# Altium schematic symbol library Capacitor - Ceramic - Sumsung.SchLib: 1421 symbols (part 6 of 8) (continued)
## CL31B225KAHNFNE (continued)
CAP CER 2.2UF 25V X7R 1206; Part Number: CL31B225KAHNFNE; Manufacturer: Samsung Electro-Mechanics America, Inc.; TemperatureRange: -55C ~ 125C; Tolerance: 10%; Value: 2.2uF; PartId: 17980; Supplier 1: Digi-Key; Supplier Part Number 1: 1276-3134-2-ND; ComponentLink1Description: Datasheet; ComponentLink1URL: //media.digikey.com/pdf/Data%20Sheets/Samsung%20PDFs/CL31B225KAHNFNE_Spec.pdf; ComponentLink2Description: Digi-Key Listing; ComponentLink2URL: https://www.digikey.com/product-detail/en/samsung-electro-mechanics-america-inc/CL31B225KAHNFNE/1276-3134-2-ND/3888792; TemperatureCoefficient: X7R; Voltage: 25V; Price: 0.0654; Device Package: 1206 (3216 Metric)
footprint CAP 1206/3216 - 1.8MM
pins: 1, 2

## CL31B225KAHNNNE
designator C?, comment 2.2uF
CAP CER 2.2UF 25V X7R 1206; Part Number: CL31B225KAHNNNE; Manufacturer: Samsung Electro-Mechanics America, Inc.; TemperatureRange: -55C ~ 125C; Tolerance: 10%; Value: 2.2uF; PartId: 6168; Supplier 1: Digi-Key; Supplier Part Number 1: 1276-1072-2-ND; ComponentLink1Description: Datasheet; ComponentLink1URL: http://www.samsungsem.com/kr/front/downloadcms.do?path=/kr/support/product-search/mlcc/__icsFiles/afieldfile/2014/11/05&fileName=C_CL31B225KAHNNNE.pdf; ComponentLink2Description: Digi-Key listing; ComponentLink2URL: http://digikey.com/product-detail/en/CL31B225KAHNNNE/1276-1072-2-ND/3886730; TemperatureCoefficient: X7R; Voltage: 25V; Price: 0.0624; Type: -; Device Package: 1206 (3216 Metric)
footprint CAP 1206/3216
pins: 1, 2

## CL31B225KBH4PNE
designator C?, comment 2.2uF
CAP CER 2.2UF 50V X7R 1206; Part Number: CL31B225KBH4PNE; Manufacturer: Samsung Electro-Mechanics America, Inc.; TemperatureRange: -55C ~ 125C; Tolerance: 10%; Type: Open Mode, Soft Termination; Value: 2.2uF; PartId: 6224; Supplier 1: Digi-Key; Supplier Part Number 1: 1276-3136-2-ND; ComponentLink1Description: Datasheet; ComponentLink1URL: http://media.digikey.com/pdf/Data%20Sheets/Samsung%20PDFs/CL31B225KBH4PNE_Spec.pdf; ComponentLink2Description: Digi-Key listing; ComponentLink2URL: http://digikey.com/product-detail/en/CL31B225KBH4PNE/1276-3136-2-ND/3888794; TemperatureCoefficient: X7R; Voltage: 50V; Price: 0.1763; Device Package: 1206 (3216 Metric)
footprint CAP 1206/3216
pins: 1, 2

## CL31B225KBHNFNE
designator C?, comment 2.2uF
CAP CER 2.2UF 50V X7R 1206; Part Number: CL31B225KBHNFNE; Manufacturer: Samsung Electro-Mechanics America, Inc.; TemperatureRange: -55C ~ 125C; Tolerance: 10%; Value: 2.2uF; PartId: 17650; Supplier 1: Digi-Key; Supplier Part Number 1: 1276-3137-2-ND; ComponentLink1Description: Datasheet; ComponentLink1URL: //media.digikey.com/pdf/Data%20Sheets/Samsung%20PDFs/CL31B225KBHNFNE_Spec.pdf; ComponentLink2Description: Digi-Key Listing; ComponentLink2URL: https://www.digikey.com/product-detail/en/samsung-electro-mechanics-america-inc/CL31B225KBHNFNE/1276-3137-2-ND/3888795; TemperatureCoefficient: X7R; Voltage: 50V; Price: 0.0695; Device Package: 1206 (3216 Metric)
footprint CAP 1206/3216 - 1.8MM
pins: 1, 2

## CL31B225KBHNNNE
designator C?, comment 2.2uF
CAP CER 2.2UF 50V X7R 1206; Part Number: CL31B225KBHNNNE; Manufacturer: Samsung Electro-Mechanics America, Inc.; TemperatureRange: -55C ~ 125C; Tolerance: 10%; Value: 2.2uF; PartId: 6173; Supplier 1: Digi-Key; Supplier Part Number 1: 1276-1291-2-ND; ComponentLink1Description: Datasheet; ComponentLink1URL: http://www.samsungsem.com/kr/front/downloadcms.do?path=/kr/support/product-search/mlcc/__icsFiles/afieldfile/2014/11/05&fileName=C_CL31B225KBHNNNE.pdf; ComponentLink2Description: Digi-Key listing; ComponentLink2URL: http://digikey.com/product-detail/en/CL31B225KBHNNNE/1276-1291-2-ND/3886949; TemperatureCoefficient: X7R; Voltage: 50V; Price: 0.0663; Type: -; Device Package: 1206 (3216 Metric)
footprint CAP 1206/3216
pins: 1, 2

## CL31B225KBHVPNE
designator C?, comment 2.2uF
CAP CER 2.2UF 50V X7R 1206; Part Number: CL31B225KBHVPNE; Manufacturer: Samsung Electro-Mechanics America, Inc.; TemperatureRange: -55C ~ 125C; Tolerance: 10%; Value: 2.2uF; PartId: 17750; Supplier 1: Digi-Key; Supplier Part Number 1: 1276-6735-2-ND; ComponentLink1Description: Datasheet; ComponentLink1URL: //media.digikey.com/pdf/Data%20Sheets/Samsung%20PDFs/MLCC_Catalog_2015.pdf; ComponentLink2Description: Digi-Key Listing; ComponentLink2URL: https://www.digikey.com/product-detail/en/samsung-electro-mechanics-america-inc/CL31B225KBHVPNE/1276-6735-2-ND/5961219; TemperatureCoefficient: X7R; Voltage: 50V; Price: 0.1068; Device Package: 1206 (3216 Metric)
footprint CAP 1206/3216 - 1.8MM
pins: 1, 2

## CL31B225KCHSNNE
designator C?, comment 2.2uF
CAP CER 2.2UF 100V X7R 1206; Part Number: CL31B225KCHSNNE; Manufacturer: Samsung Electro-Mechanics America, Inc.; TemperatureRange: -55C ~ 125C; Tolerance: 10%; Value: 2.2uF; PartId: 6260; Supplier 1: Digi-Key; Supplier Part Number 1: 1276-3138-2-ND; ComponentLink1Description: Datasheet; ComponentLink1URL: http://media.digikey.com/pdf/Data%20Sheets/Samsung%20PDFs/CL31B225KCHSNNE_Spec.pdf; ComponentLink2Description: Digi-Key listing; ComponentLink2URL: http://digikey.com/product-detail/en/CL31B225KCHSNNE/1276-3138-2-ND/3888796; TemperatureCoefficient: X7R; Voltage: 100V; Price: 0.3227; Type: -; Device Package: 1206 (3216 Metric)
footprint CAP 1206/3216
pins: 1, 2

## CL31B225KOHNFNE
designator C?, comment 2.2uF
CAP CER 2.2UF 16V X7R 1206; Part Number: CL31B225KOHNFNE; Manufacturer: Samsung Electro-Mechanics America, Inc.; TemperatureRange: -55C ~ 125C; Tolerance: 10%; Value: 2.2uF; PartId: 17623; Supplier 1: Digi-Key; Supplier Part Number 1: 1276-3140-2-ND; ComponentLink1Description: Datasheet; ComponentLink1URL: //media.digikey.com/pdf/Data%20Sheets/Samsung%20PDFs/CL31B225KOHNFNE_Spec.pdf; ComponentLink2Description: Digi-Key Listing; ComponentLink2URL: https://www.digikey.com/product-detail/en/samsung-electro-mechanics-america-inc/CL31B225KOHNFNE/1276-3140-2-ND/3888798; TemperatureCoefficient: X7R; Voltage: 16V; Price: 0.0562; Device Package: 1206 (3216 Metric)
footprint CAP 1206/3216 - 1.8MM
pins: 1, 2

## CL31B225KOHNNNE
designator C?, comment 2.2uF
CAP CER 2.2UF 16V X7R 1206; Part Number: CL31B225KOHNNNE; Manufacturer: Samsung Electro-Mechanics America, Inc.; TemperatureRange: -55C ~ 125C; Tolerance: 10%; Value: 2.2uF; PartId: 17506; Supplier 1: Digi-Key; Supplier Part Number 1: 1276-1264-2-ND; ComponentLink1Description: Datasheet; ComponentLink1URL: http://www.samsungsem.com/kr/front/downloadcms.do?path=/kr/support/product-search/mlcc/__icsFiles/afieldfile/2014/11/05&fileName=C_CL31B225KOHNNNE.pdf; ComponentLink2Description: Digi-Key Listing; ComponentLink2URL: https://www.digikey.com/product-detail/en/samsung-electro-mechanics-america-inc/CL31B225KOHNNNE/1276-1264-2-ND/3886922; TemperatureCoefficient: X7R; Voltage: 16V; Price: 0.0562; Device Package: 1206 (3216 Metric)
footprint CAP 1206/3216 - 1.8MM
pins: 1, 2

## CL31B225KOHNNWE
designator C?, comment 2.2uF
CAP CER 2.2UF 16V X7R 1206; Part Number: CL31B225KOHNNWE; Manufacturer: Samsung Electro-Mechanics America, Inc.; TemperatureRange: -55C ~ 125C; Tolerance: 10%; Value: 2.2uF; PartId: 17899; Supplier 1: Digi-Key; Supplier Part Number 1: 1276-3141-2-ND; ComponentLink1Description: Datasheet; ComponentLink1URL: //media.digikey.com/pdf/Data%20Sheets/Samsung%20PDFs/CL31B225KOHNNWE_Spec.pdf; ComponentLink2Description: Digi-Key Listing; ComponentLink2URL: https://www.digikey.com/product-detail/en/samsung-electro-mechanics-america-inc/CL31B225KOHNNWE/1276-3141-2-ND/3888799; TemperatureCoefficient: X7R; Voltage: 16V; Price: 0.0562; Device Package: 1206 (3216 Metric)
footprint CAP 1206/3216 - 1.8MM
pins: 1, 2

## CL31B225MOHNNNE
designator C?, comment 2.2uF
CAP CER 2.2UF 16V X7R 1206; Part Number: CL31B225MOHNNNE; Manufacturer: Samsung Electro-Mechanics America, Inc.; TemperatureRange: -55C ~ 125C; Tolerance: 20%; Value: 2.2uF; PartId: 6166; Supplier 1: Digi-Key; Supplier Part Number 1: 1276-3143-2-ND; ComponentLink1Description: Datasheet; ComponentLink1URL: http://media.digikey.com/pdf/Data%20Sheets/Samsung%20PDFs/CL31B225MOHNNNE_Spec.pdf; ComponentLink2Description: Digi-Key listing; ComponentLink2URL: http://digikey.com/product-detail/en/CL31B225MOHNNNE/1276-3143-2-ND/3888801; TemperatureCoefficient: X7R; Voltage: 16V; Price: 0.0537; Type: -; Device Package: 1206 (3216 Metric)
footprint CAP 1206/3216
pins: 1, 2

## CL31B226KPHNFNE
designator C?, comment 22uF
CAP CER 22UF 10V X7R 1206; Part Number: CL31B226KPHNFNE; Manufacturer: Samsung Electro-Mechanics America, Inc.; TemperatureRange: -55C ~ 125C; Tolerance: 10%; Value: 22uF; PartId: 15910; Supplier 1: Digi-Key; Supplier Part Number 1: 1276-3145-2-ND; ComponentLink1Description: Datasheet; ComponentLink1URL: //media.digikey.com/pdf/Data%20Sheets/Samsung%20PDFs/CL31B226KPHNFNE_Character.pdf; ComponentLink2Description: Digi-Key Listing; ComponentLink2URL: https://www.digikey.com/product-detail/en/samsung-electro-mechanics-america-inc/CL31B226KPHNFNE/1276-3145-2-ND/3888803; TemperatureCoefficient: X7R; Voltage: 10V; Price: 0.1682; Device Package: 1206 (3216 Metric)
footprint CAP 1206/3216
pins: 1, 2

## CL31B226KPHNNNE
designator C?, comment 22uF
CAP CER 22UF 10V X7R 1206; Part Number: CL31B226KPHNNNE; Manufacturer: Samsung Electro-Mechanics America, Inc.; TemperatureRange: -55C ~ 125C; Tolerance: 10%; Value: 22uF; PartId: 6218; Supplier 1: Digi-Key; Supplier Part Number 1: 1276-2769-2-ND; ComponentLink1Description: Datasheet; ComponentLink1URL: http://www.samsungsem.com/kr/support/product-search/mlcc/CL31B226KPHNNNE.jsp; ComponentLink2Description: Digi-Key listing; ComponentLink2URL: http://digikey.com/product-detail/en/CL31B226KPHNNNE/1276-2769-2-ND/3888427; TemperatureCoefficient: X7R; Voltage: 10V; Price: 0.1652; Type: -; Device Package: 1206 (3216 Metric)
footprint CAP 1206/3216
pins: 1, 2

## CL31B226KQHNNNE
designator C?, comment 22uF
CAP CER 22UF 6.3V X7R 1206; Part Number: CL31B226KQHNNNE; Manufacturer: Samsung Electro-Mechanics America, Inc.; TemperatureRange: -55C ~ 125C; Tolerance: 10%; Value: 22uF; PartId: 15909; Supplier 1: Digi-Key; Supplier Part Number 1: 1276-3146-2-ND; ComponentLink1Description: Datasheet; ComponentLink1URL: //media.digikey.com/pdf/Data%20Sheets/Samsung%20PDFs/CL31B226KQHNNNE_Spec.pdf; ComponentLink2Description: Digi-Key Listing; ComponentLink2URL: https://www.digikey.com/product-detail/en/samsung-electro-mechanics-america-inc/CL31B226KQHNNNE/1276-3146-2-ND/3888804; TemperatureCoefficient: X7R; Voltage: 6.3V; Price: 0.1682; Device Package: 1206 (3216 Metric)
footprint CAP 1206/3216
pins: 1, 2

## CL31B226KQHNNWE
designator C?, comment 22uF
CAP CER 22UF 6.3V X7R 1206; Part Number: CL31B226KQHNNWE; Manufacturer: Samsung Electro-Mechanics America, Inc.; TemperatureRange: -55C ~ 125C; Tolerance: 10%; Value: 22uF; PartId: 15990; Supplier 1: Digi-Key; Supplier Part Number 1: 1276-3147-2-ND; ComponentLink1Description: Datasheet; ComponentLink1URL: //media.digikey.com/pdf/Data%20Sheets/Samsung%20PDFs/CL31B226KQHNNWE_Character.pdf; ComponentLink2Description: Digi-Key Listing; ComponentLink2URL: https://www.digikey.com/product-detail/en/samsung-electro-mechanics-america-inc/CL31B226KQHNNWE/1276-3147-2-ND/3888805; TemperatureCoefficient: X7R; Voltage: 6.3V; Price: 0.1682; Device Package: 1206 (3216 Metric)
footprint CAP 1206/3216
pins: 1, 2

## CL31B226MPHNNNE
designator C?, comment 22uF
CAP CER 22UF 10V X7R 1206; Part Number: CL31B226MPHNNNE; Manufacturer: Samsung Electro-Mechanics America, Inc.; TemperatureRange: -55C ~ 125C; Tolerance: 20%; Value: 22uF; PartId: 15898; Supplier 1: Digi-Key; Supplier Part Number 1: 1276-3148-2-ND; ComponentLink1Description: Datasheet; ComponentLink1URL: //media.digikey.com/pdf/Data%20Sheets/Samsung%20PDFs/CL31B226MPHNNNE_Character.pdf; ComponentLink2Description: Digi-Key Listing; ComponentLink2URL: https://www.digikey.com/product-detail/en/samsung-electro-mechanics-america-inc/CL31B226MPHNNNE/1276-3148-2-ND/3888806; TemperatureCoefficient: X7R; Voltage: 10V; Price: 0.1441; Device Package: 1206 (3216 Metric)
footprint CAP 1206/3216
pins: 1, 2

## CL31B331KBCNNNC
designator C?, comment 330pF
CAP CER 330PF 50V X7R 1206; Part Number: CL31B331KBCNNNC; Manufacturer: Samsung Electro-Mechanics America, Inc.; TemperatureRange: -55C ~ 125C; Tolerance: 10%; Value: 330pF; PartId: 17292; Supplier 1: Digi-Key; Supplier Part Number 1: 1276-2771-2-ND; ComponentLink1Description: Datasheet; ComponentLink1URL: http://www.samsungsem.com/kr/support/product-search/mlcc/__icsFiles/afieldfile/2016/08/18/S_CL31B331KBCNNNC.pdf; ComponentLink2Description: Digi-Key Listing; ComponentLink2URL: https://www.digikey.com/product-detail/en/samsung-electro-mechanics-america-inc/CL31B331KBCNNNC/1276-2771-2-ND/3888429; TemperatureCoefficient: X7R; Voltage: 50V; Price: 0.0325; Device Package: 1206 (3216 Metric)
footprint CAP 1206/3216 - 1.0MM
pins: 1, 2

## CL31B331KHFNNNE
designator C?, comment 330pF
CAP CER 330PF 630V X7R 1206; Part Number: CL31B331KHFNNNE; Manufacturer: Samsung Electro-Mechanics America, Inc.; TemperatureRange: -55C ~ 125C; Tolerance: 10%; Value: 330pF; PartId: 15479; Supplier 1: Digi-Key; Supplier Part Number 1: 1276-3150-2-ND; ComponentLink1Description: Datasheet; ComponentLink1URL: //media.digikey.com/pdf/Data%20Sheets/Samsung%20PDFs/CL31B331KHFNNNE_Spec.pdf; ComponentLink2Description: Digi-Key Listing; ComponentLink2URL: https://www.digikey.com/product-detail/en/samsung-electro-mechanics-america-inc/CL31B331KHFNNNE/1276-3150-2-ND/3888808; TemperatureCoefficient: X7R; Voltage: 630V; Price: 0.0495; Device Package: 1206 (3216 Metric)
footprint CAP 1206/3216
pins: 1, 2

## CL31B332KBCNNNC
designator C?, comment 3300pF
CAP CER 3300PF 50V X7R 1206; Part Number: CL31B332KBCNNNC; Manufacturer: Samsung Electro-Mechanics America, Inc.; TemperatureRange: -55C ~ 125C; Tolerance: 10%; Value: 3300pF; PartId: 17170; Supplier 1: Digi-Key; Supplier Part Number 1: 1276-2772-2-ND; ComponentLink1Description: Datasheet; ComponentLink1URL: http://www.samsungsem.com/kr/support/product-search/mlcc/__icsFiles/afieldfile/2016/08/18/S_CL31B332KBCNNNC.pdf; ComponentLink2Description: Digi-Key Listing; ComponentLink2URL: https://www.digikey.com/product-detail/en/samsung-electro-mechanics-america-inc/CL31B332KBCNNNC/1276-2772-2-ND/3888430; TemperatureCoefficient: X7R; Voltage: 50V; Price: 0.0325; Device Package: 1206 (3216 Metric)
footprint CAP 1206/3216 - 1.0MM
pins: 1, 2

## CL31B332KHFNFNE
designator C?, comment 3300pF
CAP CER 3300PF 630V X7R 1206; Part Number: CL31B332KHFNFNE; Manufacturer: Samsung Electro-Mechanics America, Inc.; TemperatureRange: -55C ~ 125C; Tolerance: 10%; Value: 3300pF; PartId: 15509; Supplier 1: Digi-Key; Supplier Part Number 1: 1276-3153-2-ND; ComponentLink1Description: Datasheet; ComponentLink1URL: //media.digikey.com/pdf/Data%20Sheets/Samsung%20PDFs/CL31B332KHFNFNE_Character.pdf; ComponentLink2Description: Digi-Key Listing; ComponentLink2URL: https://www.digikey.com/product-detail/en/samsung-electro-mechanics-america-inc/CL31B332KHFNFNE/1276-3153-2-ND/3888811; TemperatureCoefficient: X7R; Voltage: 630V; Price: 0.0343; Device Package: 1206 (3216 Metric)
footprint CAP 1206/3216
pins: 1, 2

## CL31B332KHFSFNE
designator C?, comment 3300pF
CAP CER 3300PF 630V X7R 1206; Part Number: CL31B332KHFSFNE; Manufacturer: Samsung Electro-Mechanics America, Inc.; TemperatureRange: -55C ~ 125C; Tolerance: 10%; Value: 3300pF; PartId: 15510; Supplier 1: Digi-Key; Supplier Part Number 1: 1276-3154-2-ND; ComponentLink1Description: Datasheet; ComponentLink1URL: //media.digikey.com/pdf/Data%20Sheets/Samsung%20PDFs/CL31B332KHFSFNE_Character.pdf; ComponentLink2Description: Digi-Key Listing; ComponentLink2URL: https://www.digikey.com/product-detail/en/samsung-electro-mechanics-america-inc/CL31B332KHFSFNE/1276-3154-2-ND/3888812; TemperatureCoefficient: X7R; Voltage: 630V; Price: 0.0343; Device Package: 1206 (3216 Metric)
footprint CAP 1206/3216
pins: 1, 2

## CL31B333JBCNNNC
designator C?, comment 0.033uF
CAP CER 0.033UF 50V X7R 1206; Part Number: CL31B333JBCNNNC; Manufacturer: Samsung Electro-Mechanics America, Inc.; TemperatureRange: -55C ~ 125C; Tolerance: 5%; Value: 0.033uF; PartId: 17165; Supplier 1: Digi-Key; Supplier Part Number 1: 1276-1774-2-ND; ComponentLink1Description: Datasheet; ComponentLink1URL: http://www.samsungsem.com/kr/support/product-search/mlcc/__icsFiles/afieldfile/2016/08/18/S_CL31B333JBCNNNC.pdf; ComponentLink2Description: Digi-Key Listing; ComponentLink2URL: https://www.digikey.com/product-detail/en/samsung-electro-mechanics-america-inc/CL31B333JBCNNNC/1276-1774-2-ND/3887432; TemperatureCoefficient: X7R; Voltage: 50V; Price: 0.0365; Device Package: 1206 (3216 Metric)
footprint CAP 1206/3216 - 1.0MM
pins: 1, 2

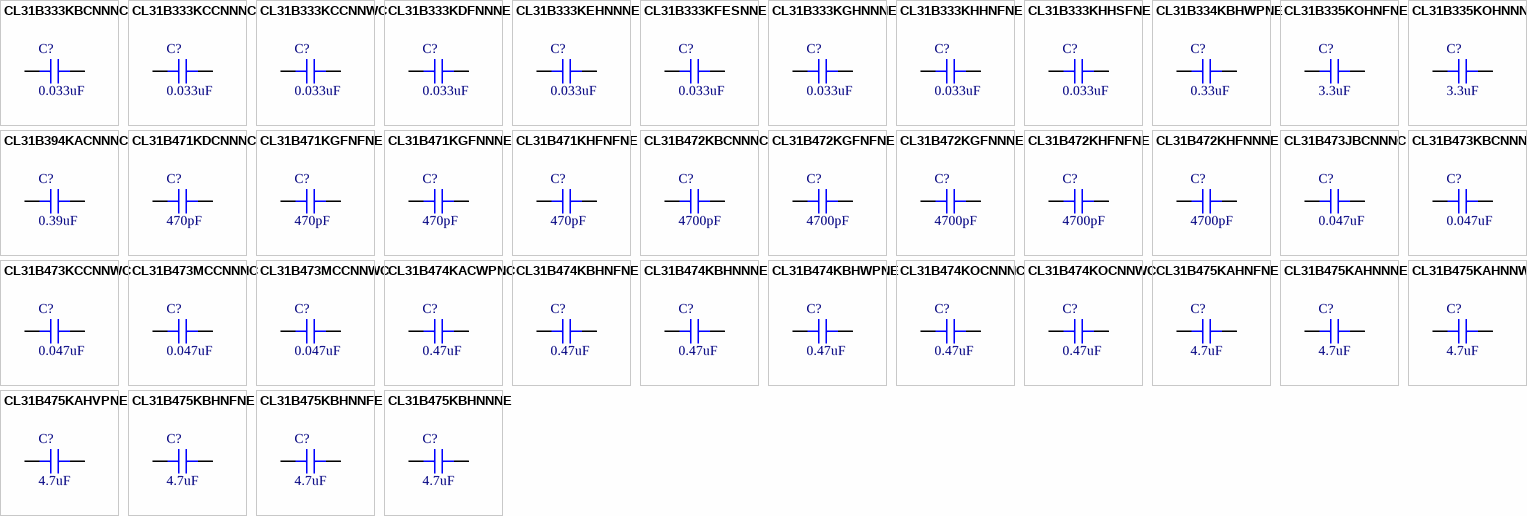
[diagram p28: symbols CL31B333KBCNNNC to CL31B475KBHNNNE]

## CL31B333KBCNNNC
designator C?, comment 0.033uF
CAP CER 0.033UF 50V X7R 1206; Part Number: CL31B333KBCNNNC; Manufacturer: Samsung Electro-Mechanics America, Inc.; TemperatureRange: -55C ~ 125C; Tolerance: 10%; Value: 0.033uF; PartId: 17307; Supplier 1: Digi-Key; Supplier Part Number 1: 1276-1805-2-ND; ComponentLink1Description: Datasheet; ComponentLink1URL: http://www.samsungsem.com/kr/support/product-search/mlcc/__icsFiles/afieldfile/2016/08/18/S_CL31B333KBCNNNC.pdf; ComponentLink2Description: Digi-Key Listing; ComponentLink2URL: https://www.digikey.com/product-detail/en/samsung-electro-mechanics-america-inc/CL31B333KBCNNNC/1276-1805-2-ND/3887463; TemperatureCoefficient: X7R; Voltage: 50V; Price: 0.0325; Device Package: 1206 (3216 Metric)
footprint CAP 1206/3216 - 1.0MM
pins: 1, 2

## CL31B333KCCNNNC
designator C?, comment 0.033uF
CAP CER 0.033UF 100V X7R 1206; Part Number: CL31B333KCCNNNC; Manufacturer: Samsung Electro-Mechanics America, Inc.; TemperatureRange: -55C ~ 125C; Tolerance: 10%; Value: 0.033uF; PartId: 17280; Supplier 1: Digi-Key; Supplier Part Number 1: 1276-1289-2-ND; ComponentLink1Description: Datasheet; ComponentLink1URL: //media.digikey.com/pdf/Data%20Sheets/Samsung%20PDFs/MLCC_Catalog_2015.pdf; ComponentLink2Description: Digi-Key Listing; ComponentLink2URL: https://www.digikey.com/product-detail/en/samsung-electro-mechanics-america-inc/CL31B333KCCNNNC/1276-1289-2-ND/3886947; TemperatureCoefficient: X7R; Voltage: 100V; Price: 0.0604; Device Package: 1206 (3216 Metric)
footprint CAP 1206/3216 - 1.0MM
pins: 1, 2

## CL31B333KCCNNWC
designator C?, comment 0.033uF
CAP CER 0.033UF 100V X7R 1206; Part Number: CL31B333KCCNNWC; Manufacturer: Samsung Electro-Mechanics America, Inc.; TemperatureRange: -55C ~ 125C; Tolerance: 10%; Value: 0.033uF; PartId: 17310; Supplier 1: Digi-Key; Supplier Part Number 1: 1276-2774-2-ND; ComponentLink1Description: Datasheet; ComponentLink1URL: //media.digikey.com/pdf/Data%20Sheets/Samsung%20PDFs/CL31B333KCCNNWC_Spec.pdf; ComponentLink2Description: Digi-Key Listing; ComponentLink2URL: https://www.digikey.com/product-detail/en/samsung-electro-mechanics-america-inc/CL31B333KCCNNWC/1276-2774-2-ND/3888432; TemperatureCoefficient: X7R; Voltage: 100V; Price: 0.0333; Device Package: 1206 (3216 Metric)
footprint CAP 1206/3216 - 1.0MM
pins: 1, 2

## CL31B333KDFNNNE
designator C?, comment 0.033uF
CAP CER 0.033UF 200V X7R 1206; Part Number: CL31B333KDFNNNE; Manufacturer: Samsung Electro-Mechanics America, Inc.; TemperatureRange: -55C ~ 125C; Tolerance: 10%; Value: 0.033uF; PartId: 15485; Supplier 1: Digi-Key; Supplier Part Number 1: 1276-3155-2-ND; ComponentLink1Description: Datasheet; ComponentLink1URL: //media.digikey.com/pdf/Data%20Sheets/Samsung%20PDFs/CL31B333KDFNNNE_Spec.pdf; ComponentLink2Description: Digi-Key Listing; ComponentLink2URL: https://www.digikey.com/product-detail/en/samsung-electro-mechanics-america-inc/CL31B333KDFNNNE/1276-3155-2-ND/3888813; TemperatureCoefficient: X7R; Voltage: 200V; Price: 0.0756; Device Package: 1206 (3216 Metric)
footprint CAP 1206/3216
pins: 1, 2

## CL31B333KEHNNNE
designator C?, comment 0.033uF
CAP CER 0.033UF 250V X7R 1206; Part Number: CL31B333KEHNNNE; Manufacturer: Samsung Electro-Mechanics America, Inc.; TemperatureRange: -55C ~ 125C; Tolerance: 10%; Value: 0.033uF; PartId: 17763; Supplier 1: Digi-Key; Supplier Part Number 1: 1276-6688-2-ND; ComponentLink1Description: Datasheet; ComponentLink1URL: //media.digikey.com/pdf/Data%20Sheets/Samsung%20PDFs/CL_Series_MLCC_ds.pdf; ComponentLink2Description: Digi-Key Listing; ComponentLink2URL: https://www.digikey.com/product-detail/en/samsung-electro-mechanics-america-inc/CL31B333KEHNNNE/1276-6688-2-ND/5961172; TemperatureCoefficient: X7R; Voltage: 250V; Price: 0.0559; Device Package: 1206 (3216 Metric)
footprint CAP 1206/3216 - 1.8MM
pins: 1, 2

## CL31B333KFESNNE
designator C?, comment 0.033uF
CAP CER 0.033UF 350V X7R 1206; Part Number: CL31B333KFESNNE; Manufacturer: Samsung Electro-Mechanics America, Inc.; TemperatureRange: -55C ~ 125C; Tolerance: 10%; Value: 0.033uF; PartId: 15441; Supplier 1: Digi-Key; Supplier Part Number 1: 1276-3156-2-ND; ComponentLink1Description: Datasheet; ComponentLink1URL: http://www.samsungsem.com/kr/support/product-search/mlcc/CL31B333KFESNNE.jsp; ComponentLink2Description: Digi-Key Listing; ComponentLink2URL: https://www.digikey.com/product-detail/en/samsung-electro-mechanics-america-inc/CL31B333KFESNNE/1276-3156-2-ND/3888814; TemperatureCoefficient: X7R; Voltage: 350V; Price: 0.0529; Device Package: 1206 (3216 Metric)
footprint CAP 1206/3216
pins: 1, 2

## CL31B333KGHNNNE
designator C?, comment 0.033uF
CAP CER 0.033UF 500V X7R 1206; Part Number: CL31B333KGHNNNE; Manufacturer: Samsung Electro-Mechanics America, Inc.; TemperatureRange: -55C ~ 125C; Tolerance: 10%; Value: 0.033uF; PartId: 15473; Supplier 1: Digi-Key; Supplier Part Number 1: 1276-3157-2-ND; ComponentLink1Description: Datasheet; ComponentLink1URL: //media.digikey.com/pdf/Data%20Sheets/Samsung%20PDFs/CL31B333KGHNNNE_Spec.pdf; ComponentLink2Description: Digi-Key Listing; ComponentLink2URL: https://www.digikey.com/product-detail/en/samsung-electro-mechanics-america-inc/CL31B333KGHNNNE/1276-3157-2-ND/3888815; TemperatureCoefficient: X7R; Voltage: 500V; Price: 0.0893; Device Package: 1206 (3216 Metric)
footprint CAP 1206/3216
pins: 1, 2

## CL31B333KHHNFNE
designator C?, comment 0.033uF
CAP CER 0.033UF 630V X7R 1206; Part Number: CL31B333KHHNFNE; Manufacturer: Samsung Electro-Mechanics America, Inc.; TemperatureRange: -55C ~ 125C; Tolerance: 10%; Value: 0.033uF; PartId: 15463; Supplier 1: Digi-Key; Supplier Part Number 1: 1276-3158-2-ND; ComponentLink1Description: Datasheet; ComponentLink1URL: //media.digikey.com/pdf/Data%20Sheets/Samsung%20PDFs/CL31B333KHHNFNE_Spec.pdf; ComponentLink2Description: Digi-Key Listing; ComponentLink2URL: https://www.digikey.com/product-detail/en/samsung-electro-mechanics-america-inc/CL31B333KHHNFNE/1276-3158-2-ND/3888816; TemperatureCoefficient: X7R; Voltage: 630V; Price: 0.07; Device Package: 1206 (3216 Metric)
footprint CAP 1206/3216
pins: 1, 2

## CL31B333KHHSFNE
designator C?, comment 0.033uF
CAP CER 0.033UF 630V X7R 1206; Part Number: CL31B333KHHSFNE; Manufacturer: Samsung Electro-Mechanics America, Inc.; TemperatureRange: -55C ~ 125C; Tolerance: 10%; Value: 0.033uF; PartId: 15457; Supplier 1: Digi-Key; Supplier Part Number 1: 1276-3159-2-ND; ComponentLink1Description: Datasheet; ComponentLink1URL: //media.digikey.com/pdf/Data%20Sheets/Samsung%20PDFs/CL31B333KHHSFNE_Character.pdf; ComponentLink2Description: Digi-Key Listing; ComponentLink2URL: https://www.digikey.com/product-detail/en/samsung-electro-mechanics-america-inc/CL31B333KHHSFNE/1276-3159-2-ND/3888817; TemperatureCoefficient: X7R; Voltage: 630V; Price: 0.0599; Device Package: 1206 (3216 Metric)
footprint CAP 1206/3216
pins: 1, 2

## CL31B334KBHWPNE
designator C?, comment 0.33uF
CAP CER 0.33UF 50V X7R 1206; Part Number: CL31B334KBHWPNE; Manufacturer: Samsung Electro-Mechanics America, Inc.; TemperatureRange: -55C ~ 125C; Tolerance: 10%; Value: 0.33uF; PartId: 17762; Supplier 1: Digi-Key; Supplier Part Number 1: 1276-6674-2-ND; ComponentLink1Description: Datasheet; ComponentLink1URL: //media.digikey.com/pdf/Data%20Sheets/Samsung%20PDFs/MLCC_Catalog_2015.pdf; ComponentLink2Description: Digi-Key Listing; ComponentLink2URL: https://www.digikey.com/product-detail/en/samsung-electro-mechanics-america-inc/CL31B334KBHWPNE/1276-6674-2-ND/5961158; TemperatureCoefficient: X7R; Voltage: 50V; Price: 0.0662; Device Package: 1206 (3216 Metric)
footprint CAP 1206/3216 - 1.8MM
pins: 1, 2

## CL31B335KOHNFNE
designator C?, comment 3.3uF
CAP CER 3.3UF 16V X7R 1206; Part Number: CL31B335KOHNFNE; Manufacturer: Samsung Electro-Mechanics America, Inc.; TemperatureRange: -55C ~ 125C; Tolerance: 10%; Value: 3.3uF; PartId: 17545; Supplier 1: Digi-Key; Supplier Part Number 1: 1276-3161-2-ND; ComponentLink1Description: Datasheet; ComponentLink1URL: //media.digikey.com/pdf/Data%20Sheets/Samsung%20PDFs/CL31B335KOHNFNE_Spec.pdf; ComponentLink2Description: Digi-Key Listing; ComponentLink2URL: https://www.digikey.com/product-detail/en/samsung-electro-mechanics-america-inc/CL31B335KOHNFNE/1276-3161-2-ND/3888819; TemperatureCoefficient: X7R; Voltage: 16V; Price: 0.1053; Device Package: 1206 (3216 Metric)
footprint CAP 1206/3216 - 1.8MM
pins: 1, 2

## CL31B335KOHNNNE
designator C?, comment 3.3uF
CAP CER 3.3UF 16V X7R 1206; Part Number: CL31B335KOHNNNE; Manufacturer: Samsung Electro-Mechanics America, Inc.; TemperatureRange: -55C ~ 125C; Tolerance: 10%; Value: 3.3uF; PartId: 6193; Supplier 1: Digi-Key; Supplier Part Number 1: 1276-1841-2-ND; ComponentLink1Description: Datasheet; ComponentLink1URL: http://www.samsungsem.com/kr/front/downloadcms.do?path=/kr/support/product-search/mlcc/__icsFiles/afieldfile/2014/11/05&fileName=C_CL31B335KOHNNNE.pdf; ComponentLink2Description: Digi-Key listing; ComponentLink2URL: http://digikey.com/product-detail/en/CL31B335KOHNNNE/1276-1841-2-ND/3887499; TemperatureCoefficient: X7R; Voltage: 16V; Price: 0.1004; Type: -; Device Package: 1206 (3216 Metric)
footprint CAP 1206/3216
pins: 1, 2

## CL31B394KACNNNC
designator C?, comment 0.39uF
CAP CER 0.39UF 25V X7R 1206; Part Number: CL31B394KACNNNC; Manufacturer: Samsung Electro-Mechanics America, Inc.; TemperatureRange: -55C ~ 125C; Tolerance: 10%; Value: 0.39uF; PartId: 17309; Supplier 1: Digi-Key; Supplier Part Number 1: 1276-2777-2-ND; ComponentLink1Description: Datasheet; ComponentLink1URL: http://www.samsungsem.com/kr/support/product-search/mlcc/__icsFiles/afieldfile/2016/08/18/S_CL31B394KACNNNC.pdf; ComponentLink2Description: Digi-Key Listing; ComponentLink2URL: https://www.digikey.com/product-detail/en/samsung-electro-mechanics-america-inc/CL31B394KACNNNC/1276-2777-2-ND/3888435; TemperatureCoefficient: X7R; Voltage: 25V; Price: 0.0421; Device Package: 1206 (3216 Metric)
footprint CAP 1206/3216 - 1.0MM
pins: 1, 2

## CL31B471KDCNNNC
designator C?, comment 470pF
CAP CER 470PF 200V X7R 1206; Part Number: CL31B471KDCNNNC; Manufacturer: Samsung Electro-Mechanics America, Inc.; TemperatureRange: -55C ~ 125C; Tolerance: 10%; Value: 470pF; PartId: 17105; Supplier 1: Digi-Key; Supplier Part Number 1: 1276-2780-2-ND; ComponentLink1Description: Datasheet; ComponentLink1URL: //media.digikey.com/pdf/Data%20Sheets/Samsung%20PDFs/CL31B471KDCNNNC_Spec.pdf; ComponentLink2Description: Digi-Key Listing; ComponentLink2URL: https://www.digikey.com/product-detail/en/samsung-electro-mechanics-america-inc/CL31B471KDCNNNC/1276-2780-2-ND/3888438; TemperatureCoefficient: X7R; Voltage: 200V; Price: 0.0402; Device Package: 1206 (3216 Metric)
footprint CAP 1206/3216 - 1.0MM
pins: 1, 2

## CL31B471KGFNFNE
designator C?, comment 470pF
CAP CER 470PF 500V X7R 1206; Part Number: CL31B471KGFNFNE; Manufacturer: Samsung Electro-Mechanics America, Inc.; TemperatureRange: -55C ~ 125C; Tolerance: 10%; Value: 470pF; PartId: 15439; Supplier 1: Digi-Key; Supplier Part Number 1: 1276-3162-2-ND; ComponentLink1Description: Datasheet; ComponentLink1URL: //media.digikey.com/pdf/Data%20Sheets/Samsung%20PDFs/CL31B471KGFNFNE_Spec.pdf; ComponentLink2Description: Digi-Key Listing; ComponentLink2URL: https://www.digikey.com/product-detail/en/samsung-electro-mechanics-america-inc/CL31B471KGFNFNE/1276-3162-2-ND/3888820; TemperatureCoefficient: X7R; Voltage: 500V; Price: 0.0521; Device Package: 1206 (3216 Metric)
footprint CAP 1206/3216
pins: 1, 2

## CL31B471KGFNNNE
designator C?, comment 470pF
CAP CER 470PF 500V X7R 1206; Part Number: CL31B471KGFNNNE; Manufacturer: Samsung Electro-Mechanics America, Inc.; TemperatureRange: -55C ~ 125C; Tolerance: 10%; Value: 470pF; PartId: 15435; Supplier 1: Digi-Key; Supplier Part Number 1: 1276-3163-2-ND; ComponentLink1Description: Datasheet; ComponentLink1URL: //media.digikey.com/pdf/Data%20Sheets/Samsung%20PDFs/CL31B471KGFNNNE_Spec.pdf; ComponentLink2Description: Digi-Key Listing; ComponentLink2URL: https://www.digikey.com/product-detail/en/samsung-electro-mechanics-america-inc/CL31B471KGFNNNE/1276-3163-2-ND/3888821; TemperatureCoefficient: X7R; Voltage: 500V; Price: 0.0443; Device Package: 1206 (3216 Metric)
footprint CAP 1206/3216
pins: 1, 2

## CL31B471KHFNFNE
designator C?, comment 470pF
CAP CER 470PF 630V X7R 1206; Part Number: CL31B471KHFNFNE; Manufacturer: Samsung Electro-Mechanics America, Inc.; TemperatureRange: -55C ~ 125C; Tolerance: 10%; Value: 470pF; PartId: 15501; Supplier 1: Digi-Key; Supplier Part Number 1: 1276-3164-2-ND; ComponentLink1Description: Datasheet; ComponentLink1URL: //media.digikey.com/pdf/Data%20Sheets/Samsung%20PDFs/CL31B471KHFNFNE_Character.pdf; ComponentLink2Description: Digi-Key Listing; ComponentLink2URL: https://www.digikey.com/product-detail/en/samsung-electro-mechanics-america-inc/CL31B471KHFNFNE/1276-3164-2-ND/3888822; TemperatureCoefficient: X7R; Voltage: 630V; Price: 0.0802; Device Package: 1206 (3216 Metric)
footprint CAP 1206/3216
pins: 1, 2

## CL31B472KBCNNNC
designator C?, comment 4700pF
CAP CER 4700PF 50V X7R 1206; Part Number: CL31B472KBCNNNC; Manufacturer: Samsung Electro-Mechanics America, Inc.; TemperatureRange: -55C ~ 125C; Tolerance: 10%; Value: 4700pF; PartId: 17145; Supplier 1: Digi-Key; Supplier Part Number 1: 1276-1309-2-ND; ComponentLink1Description: Datasheet; ComponentLink1URL: http://www.samsungsem.com/kr/support/product-search/mlcc/__icsFiles/afieldfile/2016/08/18/S_CL31B472KBCNNNC.pdf; ComponentLink2Description: Digi-Key Listing; ComponentLink2URL: https://www.digikey.com/product-detail/en/samsung-electro-mechanics-america-inc/CL31B472KBCNNNC/1276-1309-2-ND/3886967; TemperatureCoefficient: X7R; Voltage: 50V; Price: 0.0297; Device Package: 1206 (3216 Metric)
footprint CAP 1206/3216 - 1.0MM
pins: 1, 2

## CL31B472KGFNFNE
designator C?, comment 4700pF
CAP CER 4700PF 500V X7R 1206; Part Number: CL31B472KGFNFNE; Manufacturer: Samsung Electro-Mechanics America, Inc.; TemperatureRange: -55C ~ 125C; Tolerance: 10%; Value: 4700pF; PartId: 15504; Supplier 1: Digi-Key; Supplier Part Number 1: 1276-3166-2-ND; ComponentLink1Description: Datasheet; ComponentLink1URL: //media.digikey.com/pdf/Data%20Sheets/Samsung%20PDFs/CL31B472KGFNFNE_Spec.pdf; ComponentLink2Description: Digi-Key Listing; ComponentLink2URL: https://www.digikey.com/product-detail/en/samsung-electro-mechanics-america-inc/CL31B472KGFNFNE/1276-3166-2-ND/3888824; TemperatureCoefficient: X7R; Voltage: 500V; Price: 0.053; Device Package: 1206 (3216 Metric)
footprint CAP 1206/3216
pins: 1, 2

## CL31B472KGFNNNE
designator C?, comment 4700pF
CAP CER 4700PF 500V X7R 1206; Part Number: CL31B472KGFNNNE; Manufacturer: Samsung Electro-Mechanics America, Inc.; TemperatureRange: -55C ~ 125C; Tolerance: 10%; Value: 4700pF; PartId: 15406; Supplier 1: Digi-Key; Supplier Part Number 1: 1276-3167-2-ND; ComponentLink1Description: Datasheet; ComponentLink1URL: //media.digikey.com/pdf/Data%20Sheets/Samsung%20PDFs/CL31B472KGFNNNE_Spec.pdf; ComponentLink2Description: Digi-Key Listing; ComponentLink2URL: https://www.digikey.com/product-detail/en/samsung-electro-mechanics-america-inc/CL31B472KGFNNNE/1276-3167-2-ND/3888825; TemperatureCoefficient: X7R; Voltage: 500V; Price: 0.053; Device Package: 1206 (3216 Metric)
footprint CAP 1206/3216
pins: 1, 2

## CL31B472KHFNFNE
designator C?, comment 4700pF
CAP CER 4700PF 630V X7R 1206; Part Number: CL31B472KHFNFNE; Manufacturer: Samsung Electro-Mechanics America, Inc.; TemperatureRange: -55C ~ 125C; Tolerance: 10%; Value: 4700pF; PartId: 15480; Supplier 1: Digi-Key; Supplier Part Number 1: 1276-3168-2-ND; ComponentLink1Description: Datasheet; ComponentLink1URL: //media.digikey.com/pdf/Data%20Sheets/Samsung%20PDFs/CL31B472KHFNFNE_Spec.pdf; ComponentLink2Description: Digi-Key Listing; ComponentLink2URL: https://www.digikey.com/product-detail/en/samsung-electro-mechanics-america-inc/CL31B472KHFNFNE/1276-3168-2-ND/3888826; TemperatureCoefficient: X7R; Voltage: 630V; Price: 0.054; Device Package: 1206 (3216 Metric)
footprint CAP 1206/3216
pins: 1, 2

## CL31B472KHFNNNE
designator C?, comment 4700pF
CAP CER 4700PF 630V X7R 1206; Part Number: CL31B472KHFNNNE; Manufacturer: Samsung Electro-Mechanics America, Inc.; TemperatureRange: -55C ~ 125C; Tolerance: 10%; Value: 4700pF; PartId: 15481; Supplier 1: Digi-Key; Supplier Part Number 1: 1276-3169-2-ND; ComponentLink1Description: Datasheet; ComponentLink1URL: //media.digikey.com/pdf/Data%20Sheets/Samsung%20PDFs/CL31B472KHFNNNE_Spec.pdf; ComponentLink2Description: Digi-Key Listing; ComponentLink2URL: https://www.digikey.com/product-detail/en/samsung-electro-mechanics-america-inc/CL31B472KHFNNNE/1276-3169-2-ND/3888827; TemperatureCoefficient: X7R; Voltage: 630V; Price: 0.054; Device Package: 1206 (3216 Metric)
footprint CAP 1206/3216
pins: 1, 2

## CL31B473JBCNNNC
designator C?, comment 0.047uF
CAP CER 0.047UF 50V X7R 1206; Part Number: CL31B473JBCNNNC; Manufacturer: Samsung Electro-Mechanics America, Inc.; TemperatureRange: -55C ~ 125C; Tolerance: 5%; Value: 0.047uF; PartId: 17101; Supplier 1: Digi-Key; Supplier Part Number 1: 1276-2781-2-ND; ComponentLink1Description: Datasheet; ComponentLink1URL: http://www.samsungsem.com/kr/support/product-search/mlcc/__icsFiles/afieldfile/2016/08/18/S_CL31B473JBCNNNC.pdf; ComponentLink2Description: Digi-Key Listing; ComponentLink2URL: https://www.digikey.com/product-detail/en/samsung-electro-mechanics-america-inc/CL31B473JBCNNNC/1276-2781-2-ND/3888439; TemperatureCoefficient: X7R; Voltage: 50V; Price: 0.0697; Device Package: 1206 (3216 Metric)
footprint CAP 1206/3216 - 1.0MM
pins: 1, 2

## CL31B473KBCNNNC
designator C?, comment 0.047uF
CAP CER 0.047UF 50V X7R 1206; Part Number: CL31B473KBCNNNC; Manufacturer: Samsung Electro-Mechanics America, Inc.; TemperatureRange: -55C ~ 125C; Tolerance: 10%; Value: 0.047uF; PartId: 16998; Supplier 1: Digi-Key; Supplier Part Number 1: 1276-1149-2-ND; ComponentLink1Description: Datasheet; ComponentLink1URL: http://www.samsungsem.com/kr/support/product-search/mlcc/__icsFiles/afieldfile/2016/08/18/S_CL31B473KBCNNNC.pdf; ComponentLink2Description: Digi-Key Listing; ComponentLink2URL: https://www.digikey.com/product-detail/en/samsung-electro-mechanics-america-inc/CL31B473KBCNNNC/1276-1149-2-ND/3886807; TemperatureCoefficient: X7R; Voltage: 50V; Price: 0.0371; Device Package: 1206 (3216 Metric)
footprint CAP 1206/3216 - 1.0MM
pins: 1, 2

## CL31B473KCCNNWC
designator C?, comment 0.047uF
CAP CER 0.047UF 100V X7R 1206; Part Number: CL31B473KCCNNWC; Manufacturer: Samsung Electro-Mechanics America, Inc.; TemperatureRange: -55C ~ 125C; Tolerance: 10%; Value: 0.047uF; PartId: 17278; Supplier 1: Digi-Key; Supplier Part Number 1: 1276-2783-2-ND; ComponentLink1Description: Datasheet; ComponentLink1URL: //media.digikey.com/pdf/Data%20Sheets/Samsung%20PDFs/CL31B473KCCNNWC_Spec.pdf; ComponentLink2Description: Digi-Key Listing; ComponentLink2URL: https://www.digikey.com/product-detail/en/samsung-electro-mechanics-america-inc/CL31B473KCCNNWC/1276-2783-2-ND/3888441; TemperatureCoefficient: X7R; Voltage: 100V; Price: 0.0467; Device Package: 1206 (3216 Metric)
footprint CAP 1206/3216 - 1.0MM
pins: 1, 2

## CL31B473MCCNNNC
designator C?, comment 0.047uF
CAP CER 0.047UF 100V X7R 1206; Part Number: CL31B473MCCNNNC; Manufacturer: Samsung Electro-Mechanics America, Inc.; TemperatureRange: -55C ~ 125C; Tolerance: 20%; Value: 0.047uF; PartId: 17277; Supplier 1: Digi-Key; Supplier Part Number 1: 1276-2785-2-ND; ComponentLink1Description: Datasheet; ComponentLink1URL: //media.digikey.com/pdf/Data%20Sheets/Samsung%20PDFs/MLCC_Catalog_2015.pdf; ComponentLink2Description: Digi-Key Listing; ComponentLink2URL: https://www.digikey.com/product-detail/en/samsung-electro-mechanics-america-inc/CL31B473MCCNNNC/1276-2785-2-ND/3888443; TemperatureCoefficient: X7R; Voltage: 100V; Price: 0.0467; Device Package: 1206 (3216 Metric)
footprint CAP 1206/3216 - 1.0MM
pins: 1, 2

## CL31B473MCCNNWC
designator C?, comment 0.047uF
CAP CER 0.047UF 100V X7R 1206; Part Number: CL31B473MCCNNWC; Manufacturer: Samsung Electro-Mechanics America, Inc.; TemperatureRange: -55C ~ 125C; Tolerance: 20%; Value: 0.047uF; PartId: 17308; Supplier 1: Digi-Key; Supplier Part Number 1: 1276-2786-2-ND; ComponentLink1Description: Datasheet; ComponentLink1URL: //media.digikey.com/pdf/Data%20Sheets/Samsung%20PDFs/CL31B473MCCNNWC_Spec.pdf; ComponentLink2Description: Digi-Key Listing; ComponentLink2URL: https://www.digikey.com/product-detail/en/samsung-electro-mechanics-america-inc/CL31B473MCCNNWC/1276-2786-2-ND/3888444; TemperatureCoefficient: X7R; Voltage: 100V; Price: 0.0433; Device Package: 1206 (3216 Metric)
footprint CAP 1206/3216 - 1.0MM
pins: 1, 2

## CL31B474KACWPNC
designator C?, comment 0.47uF
CAP CER 0.47UF 25V X7R 1206; Part Number: CL31B474KACWPNC; Manufacturer: Samsung Electro-Mechanics America, Inc.; TemperatureRange: -55C ~ 125C; Tolerance: 10%; Value: 0.47uF; PartId: 17354; Supplier 1: Digi-Key; Supplier Part Number 1: 1276-6732-2-ND; ComponentLink1Description: Datasheet; ComponentLink1URL: //media.digikey.com/pdf/Data%20Sheets/Samsung%20PDFs/MLCC_Catalog_2015.pdf; ComponentLink2Description: Digi-Key Listing; ComponentLink2URL: https://www.digikey.com/product-detail/en/samsung-electro-mechanics-america-inc/CL31B474KACWPNC/1276-6732-2-ND/5961216; TemperatureCoefficient: X7R; Voltage: 25V; Price: 0.0498; Device Package: 1206 (3216 Metric)
footprint CAP 1206/3216 - 1.0MM
pins: 1, 2

## CL31B474KBHNFNE
designator C?, comment 0.47uF
CAP CER 0.47UF 50V X7R 1206; Part Number: CL31B474KBHNFNE; Manufacturer: Samsung Electro-Mechanics America, Inc.; TemperatureRange: -55C ~ 125C; Tolerance: 10%; Value: 0.47uF; PartId: 17697; Supplier 1: Digi-Key; Supplier Part Number 1: 1276-3175-2-ND; ComponentLink1Description: Datasheet; ComponentLink1URL: //media.digikey.com/pdf/Data%20Sheets/Samsung%20PDFs/CL31B474KBHNFNE_Spec.pdf; ComponentLink2Description: Digi-Key Listing; ComponentLink2URL: https://www.digikey.com/product-detail/en/samsung-electro-mechanics-america-inc/CL31B474KBHNFNE/1276-3175-2-ND/3888833; TemperatureCoefficient: X7R; Voltage: 50V; Price: 0.06; Device Package: 1206 (3216 Metric)
footprint CAP 1206/3216 - 1.8MM
pins: 1, 2

## CL31B474KBHNNNE
designator C?, comment 0.47uF
CAP CER 0.47UF 50V X7R 1206; Part Number: CL31B474KBHNNNE; Manufacturer: Samsung Electro-Mechanics America, Inc.; TemperatureRange: -55C ~ 125C; Tolerance: 10%; Value: 0.47uF; PartId: 17394; Supplier 1: Digi-Key; Supplier Part Number 1: 1276-1118-2-ND; ComponentLink1Description: Datasheet; ComponentLink1URL: http://www.samsungsem.com/kr/support/product-search/mlcc/__icsFiles/afieldfile/2016/08/18/S_CL31B474KBHNNNE.pdf; ComponentLink2Description: Digi-Key Listing; ComponentLink2URL: https://www.digikey.com/product-detail/en/samsung-electro-mechanics-america-inc/CL31B474KBHNNNE/1276-1118-2-ND/3886776; TemperatureCoefficient: X7R; Voltage: 50V; Price: 0.06; Device Package: 1206 (3216 Metric)
footprint CAP 1206/3216 - 1.8MM
pins: 1, 2

## CL31B474KBHWPNE
designator C?, comment 0.47uF
CAP CER 0.47UF 50V X7R 1206; Part Number: CL31B474KBHWPNE; Manufacturer: Samsung Electro-Mechanics America, Inc.; TemperatureRange: -55C ~ 125C; Tolerance: 10%; Value: 0.47uF; PartId: 17585; Supplier 1: Digi-Key; Supplier Part Number 1: 1276-6743-2-ND; ComponentLink1Description: Datasheet; ComponentLink1URL: //media.digikey.com/pdf/Data%20Sheets/Samsung%20PDFs/MLCC_Catalog_2015.pdf; ComponentLink2Description: Digi-Key Listing; ComponentLink2URL: https://www.digikey.com/product-detail/en/samsung-electro-mechanics-america-inc/CL31B474KBHWPNE/1276-6743-2-ND/5961227; TemperatureCoefficient: X7R; Voltage: 50V; Price: 0.0662; Device Package: 1206 (3216 Metric)
footprint CAP 1206/3216 - 1.8MM
pins: 1, 2

## CL31B474KOCNNNC
designator C?, comment 0.47uF
CAP CER 0.47UF 16V X7R 1206; Part Number: CL31B474KOCNNNC; Manufacturer: Samsung Electro-Mechanics America, Inc.; TemperatureRange: -55C ~ 125C; Tolerance: 10%; Value: 0.47uF; PartId: 17281; Supplier 1: Digi-Key; Supplier Part Number 1: 1276-2787-2-ND; ComponentLink1Description: Datasheet; ComponentLink1URL: http://www.samsungsem.com/kr/support/product-search/mlcc/__icsFiles/afieldfile/2016/08/18/S_CL31B474KOCNNNC.pdf; ComponentLink2Description: Digi-Key Listing; ComponentLink2URL: https://www.digikey.com/product-detail/en/samsung-electro-mechanics-america-inc/CL31B474KOCNNNC/1276-2787-2-ND/3888445; TemperatureCoefficient: X7R; Voltage: 16V; Price: 0.0545; Device Package: 1206 (3216 Metric)
footprint CAP 1206/3216 - 1.0MM
pins: 1, 2